# Altium footprint library smd-ipc.PCBLIB: 363 footprints (part 4 of 27)
Each footprint in its own frame and in the unit in brackets; x right, y up, seen from the top. Pads: shape width x height; smd on the part's side, far side on the other; paste and mask are expansions set on the pad; w line width, h text height; cw(c..) or ccw(c..) is an arc to the next point about the centre after c.
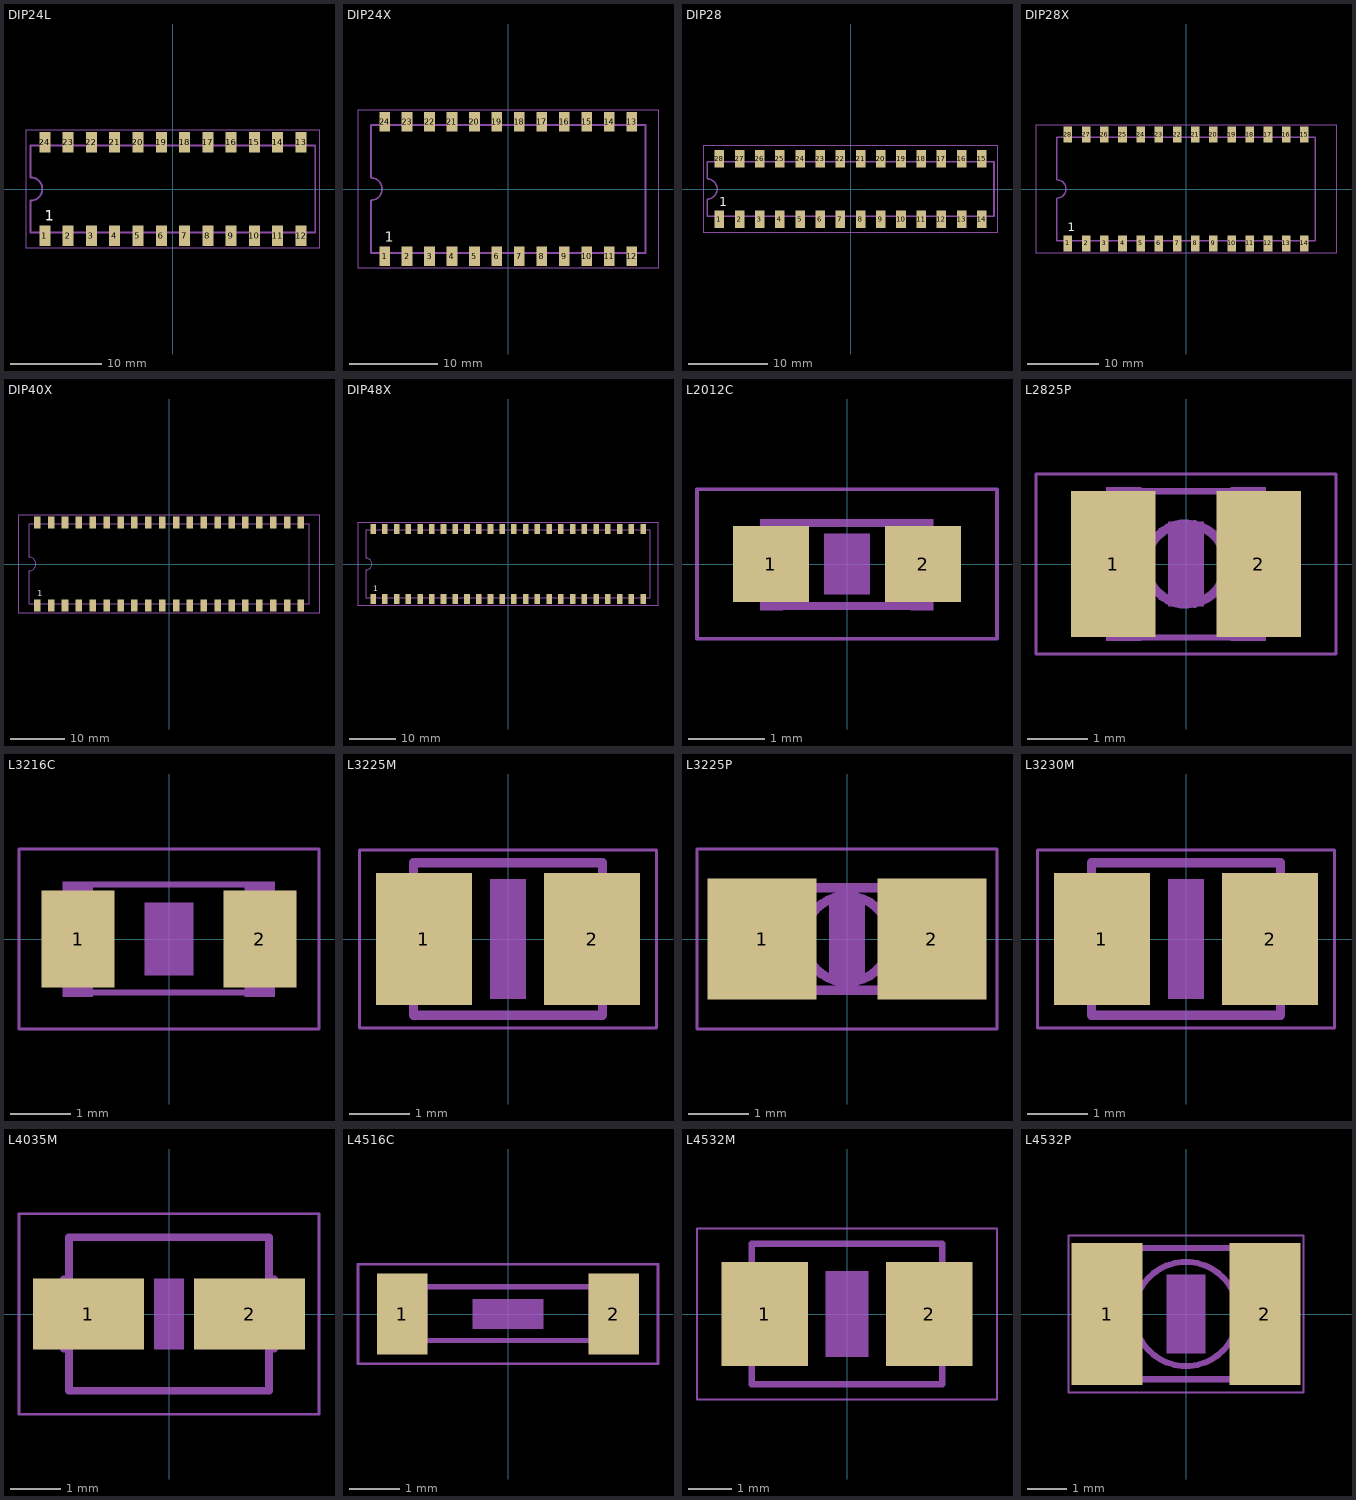
[diagram p3: the footprints below, top view; thin cyan lines are the x and y axes]

## DIP24L [mm]
pads (24):
  rect 1.2x2.2 smd: 1(-13.97,-5.1) 2(-11.43,-5.1) 3(-8.89,-5.1) 4(-6.35,-5.1) 5(-3.81,-5.1) 6(-1.27,-5.1) 7(1.27,-5.1) 8(3.81,-5.1) 9(6.35,-5.1) 10(8.89,-5.1) 11(11.43,-5.1) 12(13.97,-5.1) 13(13.97,5.1) 14(11.43,5.1) 15(8.89,5.1) 16(6.35,5.1) 17(3.81,5.1) 18(1.27,5.1) 19(-1.27,5.1) 20(-3.81,5.1) 21(-6.35,5.1) 22(-8.89,5.1) 23(-11.43,5.1) 24(-13.97,5.1)
Top Overlay:
  text "1" at -13.97,-3.84 h1.97
Mechanical 16:
  rectangle: -14.25,-5.42 -13.69,-4.75
  rectangle: -11.71,-5.42 -11.15,-4.75
  rectangle: -9.17,-5.42 -8.61,-4.75
  rectangle: -6.63,-5.42 -6.07,-4.75
  rectangle: -4.09,-5.42 -3.53,-4.75
  rectangle: -1.55,-5.42 -0.99,-4.75
  rectangle: 0.99,-5.42 1.55,-4.75
  rectangle: 3.53,-5.42 4.09,-4.75
  rectangle: 6.07,-5.42 6.63,-4.75
  rectangle: 8.61,-5.42 9.17,-4.75
  rectangle: 11.15,-5.42 11.71,-4.75
  rectangle: 13.69,-5.42 14.25,-4.75
  rectangle: 13.69,4.75 14.25,5.42
  rectangle: 11.15,4.75 11.71,5.42
  rectangle: 8.61,4.75 9.17,5.42
  rectangle: 6.07,4.75 6.63,5.42
  rectangle: 3.53,4.75 4.09,5.42
  rectangle: 0.99,4.75 1.55,5.42
  rectangle: -1.55,4.75 -0.99,5.42
  rectangle: -4.09,4.75 -3.53,5.42
  rectangle: -6.63,4.75 -6.07,5.42
  rectangle: -9.17,4.75 -8.61,5.42
  rectangle: -11.71,4.75 -11.15,5.42
  rectangle: -14.25,4.75 -13.69,5.42
  lines w0.203: -15.52,-1.27 -15.52,-4.75 15.52,-4.75 15.52,4.75 -15.52,4.75 -15.52,1.27 ; -15.518,-1.27 ccw(c-15.518,0) -15.518,1.27
Mechanical 27:
  lines w0.051: -15.973,-6.483 15.933,-6.483 15.933,6.483 -15.973,6.483 -15.973,-6.483

## DIP24X [mm]
pads (24):
  rect 1.2x2.2 smd: 1(-13.97,-7.6) 2(-11.43,-7.6) 3(-8.89,-7.6) 4(-6.35,-7.6) 5(-3.81,-7.6) 6(-1.27,-7.6) 7(1.27,-7.6) 8(3.81,-7.6) 9(6.35,-7.6) 10(8.89,-7.6) 11(11.43,-7.6) 12(13.97,-7.6) 13(13.97,7.6) 14(11.43,7.6) 15(8.89,7.6) 16(6.35,7.6) 17(3.81,7.6) 18(1.27,7.6) 19(-1.27,7.6) 20(-3.81,7.6) 21(-6.35,7.6) 22(-8.89,7.6) 23(-11.43,7.6) 24(-13.97,7.6)
Top Overlay:
  text "1" at -13.97,-6.34 h1.97
Mechanical 16:
  rectangle: -14.25,-7.92 -13.69,-7.25
  rectangle: -11.71,-7.92 -11.15,-7.25
  rectangle: -9.17,-7.92 -8.61,-7.25
  rectangle: -6.63,-7.92 -6.07,-7.25
  rectangle: -4.09,-7.92 -3.53,-7.25
  rectangle: -1.55,-7.92 -0.99,-7.25
  rectangle: 0.99,-7.92 1.55,-7.25
  rectangle: 3.53,-7.92 4.09,-7.25
  rectangle: 6.07,-7.92 6.63,-7.25
  rectangle: 8.61,-7.92 9.17,-7.25
  rectangle: 11.15,-7.92 11.71,-7.25
  rectangle: 13.69,-7.92 14.25,-7.25
  rectangle: 13.69,7.25 14.25,7.92
  rectangle: 11.15,7.25 11.71,7.92
  rectangle: 8.61,7.25 9.17,7.92
  rectangle: 6.07,7.25 6.63,7.92
  rectangle: 3.53,7.25 4.09,7.92
  rectangle: 0.99,7.25 1.55,7.92
  rectangle: -1.55,7.25 -0.99,7.92
  rectangle: -4.09,7.25 -3.53,7.92
  rectangle: -6.63,7.25 -6.07,7.92
  rectangle: -9.17,7.25 -8.61,7.92
  rectangle: -11.71,7.25 -11.15,7.92
  rectangle: -14.25,7.25 -13.69,7.92
  lines w0.203: -15.52,-1.27 -15.52,-7.25 15.52,-7.25 15.52,7.25 -15.52,7.25 -15.52,1.27 ; -15.518,-1.27 ccw(c-15.518,0) -15.518,1.27
Mechanical 27:
  lines w0.051: -16.973,-8.983 16.933,-8.983 16.933,8.983 -16.973,8.983 -16.973,-8.983

## DIP28 [mm]
pads (28):
  rect 1.2x2.2 smd: 1(-16.51,-3.8) 2(-13.97,-3.8) 3(-11.43,-3.8) 4(-8.89,-3.8) 5(-6.35,-3.8) 6(-3.81,-3.8) 7(-1.27,-3.8) 8(1.27,-3.8) 9(3.81,-3.8) 10(6.35,-3.8) 11(8.89,-3.8) 12(11.43,-3.8) 13(13.97,-3.8) 14(16.51,-3.8) 15(16.51,3.8) 16(13.97,3.8) 17(11.43,3.8) 18(8.89,3.8) 19(6.35,3.8) 20(3.81,3.8) 21(1.27,3.8) 22(-1.27,3.8) 23(-3.81,3.8) 24(-6.35,3.8) 25(-8.89,3.8) 26(-11.43,3.8) 27(-13.97,3.8) 28(-16.51,3.8)
Top Overlay:
  text "1" at -16.51,-2.54 h1.97
Mechanical 16:
  rectangle: -16.79,-4.12 -16.23,-3.45
  rectangle: -14.25,-4.12 -13.69,-3.45
  rectangle: -11.71,-4.12 -11.15,-3.45
  rectangle: -9.17,-4.12 -8.61,-3.45
  rectangle: -6.63,-4.12 -6.07,-3.45
  rectangle: -4.09,-4.12 -3.53,-3.45
  rectangle: -1.55,-4.12 -0.99,-3.45
  rectangle: 0.99,-4.12 1.55,-3.45
  rectangle: 3.53,-4.12 4.09,-3.45
  rectangle: 6.07,-4.12 6.63,-3.45
  rectangle: 8.61,-4.12 9.17,-3.45
  rectangle: 11.15,-4.12 11.71,-3.45
  rectangle: 13.69,-4.12 14.25,-3.45
  rectangle: 16.23,-4.12 16.79,-3.45
  rectangle: 16.23,3.45 16.79,4.12
  rectangle: 13.69,3.45 14.25,4.12
  rectangle: 11.15,3.45 11.71,4.12
  rectangle: 8.61,3.45 9.17,4.12
  rectangle: 6.07,3.45 6.63,4.12
  rectangle: 3.53,3.45 4.09,4.12
  rectangle: 0.99,3.45 1.55,4.12
  rectangle: -1.55,3.45 -0.99,4.12
  rectangle: -4.09,3.45 -3.53,4.12
  rectangle: -6.63,3.45 -6.07,4.12
  rectangle: -9.17,3.45 -8.61,4.12
  rectangle: -11.71,3.45 -11.15,4.12
  rectangle: -14.25,3.45 -13.69,4.12
  rectangle: -16.79,3.45 -16.23,4.12
  lines w0.203: -18.06,-1.27 -18.06,-3.45 18.06,-3.45 18.06,3.45 -18.06,3.45 -18.06,1.27 ; -18.058,-1.27 ccw(c-18.058,0) -18.058,1.27
Mechanical 27:
  lines w0.051: -18.473,-5.483 18.433,-5.483 18.433,5.483 -18.473,5.483 -18.473,-5.483

## DIP28X [mm]
pads (28):
  rect 1.2x2.2 smd: 1(-16.51,-7.6) 2(-13.97,-7.6) 3(-11.43,-7.6) 4(-8.89,-7.6) 5(-6.35,-7.6) 6(-3.81,-7.6) 7(-1.27,-7.6) 8(1.27,-7.6) 9(3.81,-7.6) 10(6.35,-7.6) 11(8.89,-7.6) 12(11.43,-7.6) 13(13.97,-7.6) 14(16.51,-7.6) 15(16.51,7.6) 16(13.97,7.6) 17(11.43,7.6) 18(8.89,7.6) 19(6.35,7.6) 20(3.81,7.6) 21(1.27,7.6) 22(-1.27,7.6) 23(-3.81,7.6) 24(-6.35,7.6) 25(-8.89,7.6) 26(-11.43,7.6) 27(-13.97,7.6) 28(-16.51,7.6)
Top Overlay:
  text "1" at -16.51,-6.34 h1.97
Mechanical 16:
  rectangle: -16.79,-7.92 -16.23,-7.25
  rectangle: -14.25,-7.92 -13.69,-7.25
  rectangle: -11.71,-7.92 -11.15,-7.25
  rectangle: -9.17,-7.92 -8.61,-7.25
  rectangle: -6.63,-7.92 -6.07,-7.25
  rectangle: -4.09,-7.92 -3.53,-7.25
  rectangle: -1.55,-7.92 -0.99,-7.25
  rectangle: 0.99,-7.92 1.55,-7.25
  rectangle: 3.53,-7.92 4.09,-7.25
  rectangle: 6.07,-7.92 6.63,-7.25
  rectangle: 8.61,-7.92 9.17,-7.25
  rectangle: 11.15,-7.92 11.71,-7.25
  rectangle: 13.69,-7.92 14.25,-7.25
  rectangle: 16.23,-7.92 16.79,-7.25
  rectangle: 16.23,7.25 16.79,7.92
  rectangle: 13.69,7.25 14.25,7.92
  rectangle: 11.15,7.25 11.71,7.92
  rectangle: 8.61,7.25 9.17,7.92
  rectangle: 6.07,7.25 6.63,7.92
  rectangle: 3.53,7.25 4.09,7.92
  rectangle: 0.99,7.25 1.55,7.92
  rectangle: -1.55,7.25 -0.99,7.92
  rectangle: -4.09,7.25 -3.53,7.92
  rectangle: -6.63,7.25 -6.07,7.92
  rectangle: -9.17,7.25 -8.61,7.92
  rectangle: -11.71,7.25 -11.15,7.92
  rectangle: -14.25,7.25 -13.69,7.92
  rectangle: -16.79,7.25 -16.23,7.92
  lines w0.203: -18.06,-1.27 -18.06,-7.25 18.06,-7.25 18.06,7.25 -18.06,7.25 -18.06,1.27 ; -18.058,-1.27 ccw(c-18.058,0) -18.058,1.27
Mechanical 27:
  lines w0.051: -20.973,-8.983 20.933,-8.983 20.933,8.983 -20.973,8.983 -20.973,-8.983

## DIP40X [mm]
pads (40):
  rect 1.2x2.2 smd: 1(-24.13,-7.6) 2(-21.59,-7.6) 3(-19.05,-7.6) 4(-16.51,-7.6) 5(-13.97,-7.6) 6(-11.43,-7.6) 7(-8.89,-7.6) 8(-6.35,-7.6) 9(-3.81,-7.6) 10(-1.27,-7.6) 11(1.27,-7.6) 12(3.81,-7.6) 13(6.35,-7.6) 14(8.89,-7.6) 15(11.43,-7.6) 16(13.97,-7.6) 17(16.51,-7.6) 18(19.05,-7.6) 19(21.59,-7.6) 20(24.13,-7.6) 21(24.13,7.6) 22(21.59,7.6) 23(19.05,7.6) 24(16.51,7.6) 25(13.97,7.6) 26(11.43,7.6) 27(8.89,7.6) 28(6.35,7.6) 29(3.81,7.6) 30(1.27,7.6) 31(-1.27,7.6) 32(-3.81,7.6) 33(-6.35,7.6) 34(-8.89,7.6) 35(-11.43,7.6) 36(-13.97,7.6) 37(-16.51,7.6) 38(-19.05,7.6) 39(-21.59,7.6) 40(-24.13,7.6)
Top Overlay:
  text "1" at -24.13,-6.34 h1.97
Mechanical 16:
  rectangle: -24.41,-7.92 -23.85,-7.25
  rectangle: -21.87,-7.92 -21.31,-7.25
  rectangle: -19.33,-7.92 -18.77,-7.25
  rectangle: -16.79,-7.92 -16.23,-7.25
  rectangle: -14.25,-7.92 -13.69,-7.25
  rectangle: -11.71,-7.92 -11.15,-7.25
  rectangle: -9.17,-7.92 -8.61,-7.25
  rectangle: -6.63,-7.92 -6.07,-7.25
  rectangle: -4.09,-7.92 -3.53,-7.25
  rectangle: -1.55,-7.92 -0.99,-7.25
  rectangle: 0.99,-7.92 1.55,-7.25
  rectangle: 3.53,-7.92 4.09,-7.25
  rectangle: 6.07,-7.92 6.63,-7.25
  rectangle: 8.61,-7.92 9.17,-7.25
  rectangle: 11.15,-7.92 11.71,-7.25
  rectangle: 13.69,-7.92 14.25,-7.25
  rectangle: 16.23,-7.92 16.79,-7.25
  rectangle: 18.77,-7.92 19.33,-7.25
  rectangle: 21.31,-7.92 21.87,-7.25
  rectangle: 23.85,-7.92 24.41,-7.25
  rectangle: 23.85,7.25 24.41,7.92
  rectangle: 21.31,7.25 21.87,7.92
  rectangle: 18.77,7.25 19.33,7.92
  rectangle: 16.23,7.25 16.79,7.92
  rectangle: 13.69,7.25 14.25,7.92
  rectangle: 11.15,7.25 11.71,7.92
  rectangle: 8.61,7.25 9.17,7.92
  rectangle: 6.07,7.25 6.63,7.92
  rectangle: 3.53,7.25 4.09,7.92
  rectangle: 0.99,7.25 1.55,7.92
  rectangle: -1.55,7.25 -0.99,7.92
  rectangle: -4.09,7.25 -3.53,7.92
  rectangle: -6.63,7.25 -6.07,7.92
  rectangle: -9.17,7.25 -8.61,7.92
  rectangle: -11.71,7.25 -11.15,7.92
  rectangle: -14.25,7.25 -13.69,7.92
  rectangle: -16.79,7.25 -16.23,7.92
  rectangle: -19.33,7.25 -18.77,7.92
  rectangle: -21.87,7.25 -21.31,7.92
  rectangle: -24.41,7.25 -23.85,7.92
  lines w0.203: -25.68,-1.27 -25.68,-7.25 25.68,-7.25 25.68,7.25 -25.68,7.25 -25.68,1.27 ; -25.678,-1.27 ccw(c-25.678,0) -25.678,1.27
Mechanical 27:
  lines w0.051: -27.473,-8.983 27.433,-8.983 27.433,8.983 -27.473,8.983 -27.473,-8.983

## DIP48X [mm]
pads (48):
  rect 1.2x2.2 smd: 1(-29.21,-7.6) 2(-26.67,-7.6) 3(-24.13,-7.6) 4(-21.59,-7.6) 5(-19.05,-7.6) 6(-16.51,-7.6) 7(-13.97,-7.6) 8(-11.43,-7.6) 9(-8.89,-7.6) 10(-6.35,-7.6) 11(-3.81,-7.6) 12(-1.27,-7.6) 13(1.27,-7.6) 14(3.81,-7.6) 15(6.35,-7.6) 16(8.89,-7.6) 17(11.43,-7.6) 18(13.97,-7.6) 19(16.51,-7.6) 20(19.05,-7.6) 21(21.59,-7.6) 22(24.13,-7.6) 23(26.67,-7.6) 24(29.21,-7.6) 25(29.21,7.6) 26(26.67,7.6) 27(24.13,7.6) 28(21.59,7.6) 29(19.05,7.6) 30(16.51,7.6) 31(13.97,7.6) 32(11.43,7.6) 33(8.89,7.6) 34(6.35,7.6) 35(3.81,7.6) 36(1.27,7.6) 37(-1.27,7.6) 38(-3.81,7.6) 39(-6.35,7.6) 40(-8.89,7.6) 41(-11.43,7.6) 42(-13.97,7.6) 43(-16.51,7.6) 44(-19.05,7.6) 45(-21.59,7.6) 46(-24.13,7.6) 47(-26.67,7.6) 48(-29.21,7.6)
Top Overlay:
  text "1" at -29.21,-6.34 h1.97
Mechanical 16:
  rectangle: -29.49,-7.92 -28.93,-7.25
  rectangle: -26.95,-7.92 -26.39,-7.25
  rectangle: -24.41,-7.92 -23.85,-7.25
  rectangle: -21.87,-7.92 -21.31,-7.25
  rectangle: -19.33,-7.92 -18.77,-7.25
  rectangle: -16.79,-7.92 -16.23,-7.25
  rectangle: -14.25,-7.92 -13.69,-7.25
  rectangle: -11.71,-7.92 -11.15,-7.25
  rectangle: -9.17,-7.92 -8.61,-7.25
  rectangle: -6.63,-7.92 -6.07,-7.25
  rectangle: -4.09,-7.92 -3.53,-7.25
  rectangle: -1.55,-7.92 -0.99,-7.25
  rectangle: 0.99,-7.92 1.55,-7.25
  rectangle: 3.53,-7.92 4.09,-7.25
  rectangle: 6.07,-7.92 6.63,-7.25
  rectangle: 8.61,-7.92 9.17,-7.25
  rectangle: 11.15,-7.92 11.71,-7.25
  rectangle: 13.69,-7.92 14.25,-7.25
  rectangle: 16.23,-7.92 16.79,-7.25
  rectangle: 18.77,-7.92 19.33,-7.25
  rectangle: 21.31,-7.92 21.87,-7.25
  rectangle: 23.85,-7.92 24.41,-7.25
  rectangle: 26.39,-7.92 26.95,-7.25
  rectangle: 28.93,-7.92 29.49,-7.25
  rectangle: 28.93,7.25 29.49,7.92
  rectangle: 26.39,7.25 26.95,7.92
  rectangle: 23.85,7.25 24.41,7.92
  rectangle: 21.31,7.25 21.87,7.92
  rectangle: 18.77,7.25 19.33,7.92
  rectangle: 16.23,7.25 16.79,7.92
  rectangle: 13.69,7.25 14.25,7.92
  rectangle: 11.15,7.25 11.71,7.92
  rectangle: 8.61,7.25 9.17,7.92
  rectangle: 6.07,7.25 6.63,7.92
  rectangle: 3.53,7.25 4.09,7.92
  rectangle: 0.99,7.25 1.55,7.92
  rectangle: -1.55,7.25 -0.99,7.92
  rectangle: -4.09,7.25 -3.53,7.92
  rectangle: -6.63,7.25 -6.07,7.92
  rectangle: -9.17,7.25 -8.61,7.92
  rectangle: -11.71,7.25 -11.15,7.92
  rectangle: -14.25,7.25 -13.69,7.92
  rectangle: -16.79,7.25 -16.23,7.92
  rectangle: -19.33,7.25 -18.77,7.92
  rectangle: -21.87,7.25 -21.31,7.92
  rectangle: -24.41,7.25 -23.85,7.92
  rectangle: -26.95,7.25 -26.39,7.92
  rectangle: -29.49,7.25 -28.93,7.92
  lines w0.203: -30.76,-1.27 -30.76,-7.25 30.76,-7.25 30.76,7.25 -30.76,7.25 -30.76,1.27 ; -30.758,-1.27 ccw(c-30.758,0) -30.758,1.27
Mechanical 27:
  lines w0.051: -32.473,-8.983 32.433,-8.983 32.433,8.983 -32.473,8.983 -32.473,-8.983

## L2012C [mm]
pads (2):
  rect 1x1 smd: 1(-1,0) 2(1,0)
Mechanical 6:
  rectangle: -0.3,-0.4 0.3,0.4
Mechanical 16:
  rectangle: -1.143,-0.61 -0.843,0.59
  rectangle: 0.838,-0.61 1.138,0.59
  lines w0.102: -0.864,-0.553 0.864,-0.553 ; -0.864,0.54 0.864,0.54
Mechanical 27:
  lines w0.051: -1.973,-0.983 1.973,-0.983 1.973,0.983 -1.973,0.983 -1.973,-0.983

## L2825P [mm]
pads (2):
  rect 1.4x2.4 smd: 1(-1.2,0) 2(1.2,0)
Mechanical 6:
  rectangle: -0.3,-0.7 0.3,0.7
Mechanical 16:
  circle w0.152: c0,0 r0.66
  rectangle: 0.737,-1.27 1.321,1.27
  rectangle: -1.321,-1.27 -0.737,1.27
  lines w0.102: -1.34,-0.965 -1.34,0.965 ; -0.762,-1.213 0.762,-1.213 ; -0.762,1.2 0.762,1.2 ; 1.34,-0.965 1.34,0.965
Mechanical 27:
  lines w0.051: -2.473,-1.483 2.473,-1.483 2.473,1.483 -2.473,1.483 -2.473,-1.483

## L3216C [mm]
pads (2):
  rect 1.2x1.6 smd: 1(-1.5,0) 2(1.5,0)
Mechanical 6:
  rectangle: -0.4,-0.6 0.4,0.6
Mechanical 16:
  rectangle: -1.753,-0.953 -1.252,0.947
  rectangle: 1.245,-0.953 1.745,0.947
  lines w0.102: -1.27,-0.883 1.27,-0.883 ; -1.27,0.896 1.27,0.896
Mechanical 27:
  lines w0.051: -2.473,-1.483 2.473,-1.483 2.473,1.483 -2.473,1.483 -2.473,-1.483

## L3225M [mm]
pads (2):
  rect 1.6x2.2 smd: 1(-1.4,0) 2(1.4,0)
Mechanical 6:
  rectangle: -0.3,-1 0.3,1
Mechanical 16:
  lines w0.152: -1.651,-0.94 -1.651,0.94 ; 1.651,-0.94 1.651,0.94 ; -1.575,-1.27 1.575,-1.27 1.575,1.27 -1.575,1.27 -1.575,-1.27
Mechanical 27:
  lines w0.051: -2.473,-1.483 2.473,-1.483 2.473,1.483 -2.473,1.483 -2.473,-1.483

## L3225P [mm]
pads (2):
  rect 1.8x2 smd: 1(-1.4,0) 2(1.4,0)
Mechanical 6:
  rectangle: -0.3,-0.7 0.3,0.7
Mechanical 16:
  circle w0.152: c0,0 r0.712
  lines w0.152: -1.676,-0.845 1.676,-0.845 ; -1.676,-0.838 -1.676,0.838 ; -1.676,0.845 1.676,0.845 ; -1.168,-0.838 -1.168,0.838 ; 1.168,-0.838 1.168,0.838 ; 1.676,-0.838 1.676,0.838
Mechanical 27:
  lines w0.051: -2.473,-1.483 2.473,-1.483 2.473,1.483 -2.473,1.483 -2.473,-1.483

## L3230M [mm]
pads (2):
  rect 1.6x2.2 smd: 1(-1.4,0) 2(1.4,0)
Mechanical 6:
  rectangle: -0.3,-1 0.3,1
Mechanical 16:
  lines w0.152: -1.651,-0.94 -1.651,0.94 ; 1.651,-0.94 1.651,0.94 ; -1.575,-1.27 1.575,-1.27 1.575,1.27 -1.575,1.27 -1.575,-1.27
Mechanical 27:
  lines w0.051: -2.473,-1.483 2.473,-1.483 2.473,1.483 -2.473,1.483 -2.473,-1.483

## L4035M [mm]
pads (2):
  rect 2.2x1.4 smd: 1(-1.6,0) 2(1.6,0)
Mechanical 6:
  rectangle: -0.3,-0.7 0.3,0.7
Mechanical 16:
  lines w0.152: -2.083,-0.686 -2.083,0.686 ; 2.083,-0.686 2.083,0.686 ; -1.981,-1.524 -1.981,1.524 1.981,1.524 1.981,-1.524 -1.981,-1.524
Mechanical 27:
  lines w0.051: -2.973,-1.983 2.973,-1.983 2.973,1.983 -2.973,1.983 -2.973,-1.983

## L4516C [mm]
pads (2):
  rect 1x1.6 smd: 1(-2.1,0) 2(2.1,0)
Mechanical 6:
  rectangle: -0.7,-0.3 0.7,0.3
Mechanical 16:
  rectangle: -2.4,-0.597 -1.6,0.603
  rectangle: 1.6,-0.603 2.4,0.597
  lines w0.102: -1.626,-0.527 1.626,-0.527 ; -1.626,0.54 1.626,0.54
Mechanical 27:
  lines w0.051: -2.973,-0.983 2.973,-0.983 2.973,0.983 -2.973,0.983 -2.973,-0.983

## L4532M [mm]
pads (2):
  rect 2x2.4 smd: 1(-1.9,0) 2(1.9,0)
Mechanical 6:
  rectangle: -0.5,-1 0.5,1
Mechanical 16:
  lines w0.152: -2.337,-1.041 -2.337,1.041 ; 2.337,-1.041 2.337,1.041 ; -2.21,-1.626 2.21,-1.626 2.21,1.626 -2.21,1.626 -2.21,-1.626
Mechanical 27:
  lines w0.051: -3.473,-1.983 3.473,-1.983 3.473,1.983 -3.473,1.983 -3.473,-1.983

## L4532P [mm]
pads (2):
  rect 1.8x3.6 smd: 1(-2,0) 2(2,0)
Mechanical 6:
  rectangle: -0.5,-1 0.5,1
Mechanical 16:
  circle w0.152: c0,0 r1.321
  lines w0.152: -2.311,-1.653 2.311,-1.653 ; -2.311,-1.626 -2.311,1.626 ; -2.311,1.675 2.311,1.675 2.311,-1.626 ; -1.448,-1.626 -1.448,1.651 ; 1.448,-1.626 1.448,1.626
Mechanical 27:
  lines w0.051: -2.973,-1.983 2.973,-1.983 2.973,1.983 -2.973,1.983 -2.973,-1.983